# Altium schematic symbol library jlcpcb_2025_04_inductors_extended_0805.schlib: 882 symbols (part 4 of 5) (continued)
## MLF2012E100JT000
designator L?  Inductance: 10uH
Inductor, 10uH, ±5%, 400mΩ, 15mA, SMD 0805; Manufacturer: TDK; Manufacturer Part Number: MLF2012E100JT000; Self-Resonant Frequency: 50MHz; Q Factor: 75@2MHz; Package Size: 0805; JLCPCB Basic Part: No; JLCPCB Part Number: C76742; Supplier 1: LCSC; Category: Inductors; Supplier Part Number 1: C76742; Tolerance: ±5%; Rated Current: 15mA; DC Resistance: 400mΩ; RoHS: Yes; ComponentLink1Description: Datasheet; ComponentLink1URL: https://wmsc.lcsc.com/wmsc/upload/file/pdf/v2/lcsc/2304140030_TDK-MLF2012E100JT000_C76742.pdf; ComponentLink2Description: JLCPCB Part URL; ComponentLink2URL: https://jlcpcb.com/partdetail/C76742; ComponentLink3Description: LCSC Part URL; ComponentLink3URL: https://lcsc.com/product-detail/Inductors-SMD_TDK-TDK-MLF2012E100JT000_C76742.html
footprint IND-0805 (0805 (2012M) Inductor)
pins: 1, 2

## MLF2012E100JTD25
designator L?  Inductance: 10uH
Inductor, 10uH, ±5%, 400mΩ, 15mA, SMD 0805; Manufacturer: TDK; Manufacturer Part Number: MLF2012E100JTD25; Self-Resonant Frequency: 50MHz; Q Factor: 75@2MHz; Package Size: 0805; JLCPCB Basic Part: No; JLCPCB Part Number: C275384; Supplier 1: LCSC; Category: Inductors; Supplier Part Number 1: C275384; Tolerance: ±5%; Rated Current: 15mA; DC Resistance: 400mΩ; RoHS: Yes; ComponentLink1Description: Datasheet; ComponentLink1URL: https://wmsc.lcsc.com/wmsc/upload/file/pdf/v2/lcsc/2304140030_TDK-MLF2012E100JTD25_C275384.pdf; ComponentLink2Description: JLCPCB Part URL; ComponentLink2URL: https://jlcpcb.com/partdetail/C275384; ComponentLink3Description: LCSC Part URL; ComponentLink3URL: https://lcsc.com/product-detail/Inductors-SMD_TDK-TDK-MLF2012E100JTD25_C275384.html
footprint IND-0805 (0805 (2012M) Inductor)
pins: 1, 2

## MLF2012E100KT000
designator L?  Inductance: 10uH
Inductor, 10uH, ±10%, 400mΩ, 15mA, SMD 0805; Manufacturer: TDK; Manufacturer Part Number: MLF2012E100KT000; Self-Resonant Frequency: 30MHz; Q Factor: 75@2MHz; Package Size: 0805; JLCPCB Basic Part: No; JLCPCB Part Number: C76743; Supplier 1: LCSC; Category: Inductors; Supplier Part Number 1: C76743; Tolerance: ±10%; Rated Current: 15mA; DC Resistance: 400mΩ; RoHS: Yes; ComponentLink1Description: Datasheet; ComponentLink1URL: https://wmsc.lcsc.com/wmsc/upload/file/pdf/v2/lcsc/2304140030_TDK-MLF2012E100KT000_C76743.pdf; ComponentLink2Description: JLCPCB Part URL; ComponentLink2URL: https://jlcpcb.com/partdetail/C76743; ComponentLink3Description: LCSC Part URL; ComponentLink3URL: https://lcsc.com/product-detail/Inductors-SMD_TDK-TDK-MLF2012E100KT000_C76743.html
footprint IND-0805 (0805 (2012M) Inductor)
pins: 1, 2

## MLF2012E100KTD25
designator L?  Inductance: 10uH
Inductor, 10uH, ±10%, 400mΩ, 15mA, SMD 0805; Manufacturer: TDK; Manufacturer Part Number: MLF2012E100KTD25; Self-Resonant Frequency: 30MHz; Q Factor: 75@2MHz; Package Size: 0805; JLCPCB Basic Part: No; JLCPCB Part Number: C524464; Supplier 1: LCSC; Category: Inductors; Supplier Part Number 1: C524464; Tolerance: ±10%; Rated Current: 15mA; DC Resistance: 400mΩ; RoHS: Yes; ComponentLink1Description: Datasheet; ComponentLink1URL: https://wmsc.lcsc.com/wmsc/upload/file/pdf/v2/lcsc/2007101533_TDK-MLF2012E100KTD25_C524464.pdf; ComponentLink2Description: JLCPCB Part URL; ComponentLink2URL: https://jlcpcb.com/partdetail/C524464; ComponentLink3Description: LCSC Part URL; ComponentLink3URL: https://lcsc.com/product-detail/Inductors-SMD_TDK-TDK-MLF2012E100KTD25_C524464.html
footprint IND-0805 (0805 (2012M) Inductor)
pins: 1, 2

## MLF2012E120KT000
designator L?  Inductance: 12uH
Inductor, 12uH, ±10%, 500mΩ, 15mA, SMD 0805; Manufacturer: TDK; Manufacturer Part Number: MLF2012E120KT000; Self-Resonant Frequency: 45MHz; Q Factor: 75@2MHz; Package Size: 0805; JLCPCB Basic Part: No; JLCPCB Part Number: C76744; Supplier 1: LCSC; Category: Inductors; Supplier Part Number 1: C76744; Tolerance: ±10%; Rated Current: 15mA; DC Resistance: 500mΩ; RoHS: Yes; ComponentLink1Description: Datasheet; ComponentLink1URL: https://wmsc.lcsc.com/wmsc/upload/file/pdf/v2/lcsc/1810132013_TDK-MLF2012E120KT000_C76744.pdf; ComponentLink2Description: JLCPCB Part URL; ComponentLink2URL: https://jlcpcb.com/partdetail/C76744; ComponentLink3Description: LCSC Part URL; ComponentLink3URL: https://lcsc.com/product-detail/Inductors-SMD_TDK-TDK-MLF2012E120KT000_C76744.html
footprint IND-0805 (0805 (2012M) Inductor)
pins: 1, 2

## MLF2012E120KTD25
designator L?  Inductance: 12uH
Inductor, 12uH, ±10%, 500mΩ, 15mA, SMD 0805; Manufacturer: TDK; Manufacturer Part Number: MLF2012E120KTD25; Self-Resonant Frequency: 45MHz; Q Factor: 75@2MHz; Package Size: 0805; JLCPCB Basic Part: No; JLCPCB Part Number: C307697; Supplier 1: LCSC; Category: Inductors; Supplier Part Number 1: C307697; Tolerance: ±10%; Rated Current: 15mA; DC Resistance: 500mΩ; RoHS: Yes; ComponentLink1Description: Datasheet; ComponentLink1URL: https://wmsc.lcsc.com/wmsc/upload/file/pdf/v2/lcsc/2304140030_TDK-MLF2012E120KTD25_C307697.pdf; ComponentLink2Description: JLCPCB Part URL; ComponentLink2URL: https://jlcpcb.com/partdetail/C307697; ComponentLink3Description: LCSC Part URL; ComponentLink3URL: https://lcsc.com/product-detail/Inductors-SMD_TDK-TDK-MLF2012E120KTD25_C307697.html
footprint IND-0805 (0805 (2012M) Inductor)
pins: 1, 2

## MLF2012K470KT000
designator L?  Inductance: 47uH
Inductor, 47uH, ±10%, 1.6Ω, 4mA, SMD 0805; Manufacturer: TDK; Manufacturer Part Number: MLF2012K470KT000; Self-Resonant Frequency: 11MHz; Q Factor: 55@2MHz; Package Size: 0805; JLCPCB Basic Part: No; JLCPCB Part Number: C275387; Supplier 1: LCSC; Category: Inductors; Supplier Part Number 1: C275387; Tolerance: ±10%; Rated Current: 4mA; DC Resistance: 1.6Ω; RoHS: Yes; ComponentLink1Description: Datasheet; ComponentLink1URL: https://wmsc.lcsc.com/wmsc/upload/file/pdf/v2/lcsc/2304140030_TDK-MLF2012K470KT000_C275387.pdf; ComponentLink2Description: JLCPCB Part URL; ComponentLink2URL: https://jlcpcb.com/partdetail/C275387; ComponentLink3Description: LCSC Part URL; ComponentLink3URL: https://lcsc.com/product-detail/Inductors-SMD_TDK-TDK-MLF2012K470KT000_C275387.html
footprint IND-0805 (0805 (2012M) Inductor)
pins: 1, 2

## MLF2012K470KTD25
designator L?  Inductance: 47uH
Inductor, 47uH, ±10%, 1.6Ω, 4mA, SMD 0805; Manufacturer: TDK; Manufacturer Part Number: MLF2012K470KTD25; Self-Resonant Frequency: 20MHz; Q Factor: 55@2MHz; Package Size: 0805; JLCPCB Basic Part: No; JLCPCB Part Number: C404479; Supplier 1: LCSC; Category: Inductors; Supplier Part Number 1: C404479; Tolerance: ±10%; Rated Current: 4mA; DC Resistance: 1.6Ω; RoHS: Yes; ComponentLink1Description: Datasheet; ComponentLink1URL: https://wmsc.lcsc.com/wmsc/upload/file/pdf/v2/lcsc/2304140030_TDK-MLF2012K470KTD25_C404479.pdf; ComponentLink2Description: JLCPCB Part URL; ComponentLink2URL: https://jlcpcb.com/partdetail/C404479; ComponentLink3Description: LCSC Part URL; ComponentLink3URL: https://lcsc.com/product-detail/Inductors-SMD_TDK-TDK-MLF2012K470KTD25_C404479.html
footprint IND-0805 (0805 (2012M) Inductor)
pins: 1, 2

## MLF2012K560KT000
designator L?  Inductance: 56uH
Inductor, 56uH, ±10%, 1.8Ω, 4mA, SMD 0805; Manufacturer: TDK; Manufacturer Part Number: MLF2012K560KT000; Self-Resonant Frequency: 10MHz; Q Factor: 55@2MHz; Package Size: 0805; JLCPCB Basic Part: No; JLCPCB Part Number: C524459; Supplier 1: LCSC; Category: Inductors; Supplier Part Number 1: C524459; Tolerance: ±10%; Rated Current: 4mA; DC Resistance: 1.8Ω; RoHS: Yes; ComponentLink1Description: Datasheet; ComponentLink1URL: https://wmsc.lcsc.com/wmsc/upload/file/pdf/v2/lcsc/2007171235_TDK-MLF2012K560KT000_C524459.pdf; ComponentLink2Description: JLCPCB Part URL; ComponentLink2URL: https://jlcpcb.com/partdetail/C524459; ComponentLink3Description: LCSC Part URL; ComponentLink3URL: https://lcsc.com/product-detail/Inductors-SMD_TDK-TDK-MLF2012K560KT000_C524459.html
footprint IND-0805 (0805 (2012M) Inductor)
pins: 1, 2

## MLI2012-2R7_F_
designator L?  Inductance: 2.7uH
Inductor, 2.7uH, ±10%, 750mΩ, 30mA, SMD 0805; Manufacturer: Meled; Manufacturer Part Number: MLI2012-2R7(F); Package Size: 0805; JLCPCB Basic Part: No; JLCPCB Part Number: C24183; Supplier 1: LCSC; Category: Inductors; Supplier Part Number 1: C24183; Tolerance: ±10%; Rated Current: 30mA; DC Resistance: 750mΩ; RoHS: Yes; ComponentLink1Description: Datasheet; ComponentLink1URL: https://wmsc.lcsc.com/wmsc/upload/file/pdf/v2/lcsc/1809140120_MetalLions-MLI2012-2R7-F_C24183.pdf; ComponentLink2Description: JLCPCB Part URL; ComponentLink2URL: https://jlcpcb.com/partdetail/C24183; ComponentLink3Description: LCSC Part URL; ComponentLink3URL: https://lcsc.com/product-detail/Inductors-SMD_Meled-Meled-MLI2012-2R7F_C24183.html
footprint IND-0805 (0805 (2012M) Inductor)
pins: 1, 2

## MLI2012-4R7_f _
designator L?  Inductance: 4.7uH
Inductor, 4.7uH, ±10%, 1Ω, 30mA, SMD 0805; Manufacturer: Meled; Manufacturer Part Number: MLI2012-4R7(f ); Package Size: 0805; JLCPCB Basic Part: No; JLCPCB Part Number: C1044; Supplier 1: LCSC; Category: Inductors; Supplier Part Number 1: C1044; Tolerance: ±10%; Rated Current: 30mA; DC Resistance: 1Ω; RoHS: Yes; ComponentLink1Description: Datasheet; ComponentLink1URL: https://wmsc.lcsc.com/wmsc/upload/file/pdf/v2/lcsc/1809192213_MetalLions-MLI2012-4R7-f-_C1044.pdf; ComponentLink2Description: JLCPCB Part URL; ComponentLink2URL: https://jlcpcb.com/partdetail/C1044; ComponentLink3Description: LCSC Part URL; ComponentLink3URL: https://lcsc.com/product-detail/Inductors-SMD_Meled-Meled-MLI2012-4R7f-_C1044.html
footprint IND-0805 (0805 (2012M) Inductor)
pins: 1, 2

## MLI2012-10N
designator L?  Inductance: 10nH
Inductor, 10nH, ±5%, 300mΩ, 300mA, SMD 0805; Manufacturer: Meled; Manufacturer Part Number: MLI2012-10N; Package Size: 0805; JLCPCB Basic Part: No; JLCPCB Part Number: C14457; Supplier 1: LCSC; Category: Inductors; Supplier Part Number 1: C14457; Tolerance: ±5%; Rated Current: 300mA; DC Resistance: 300mΩ; RoHS: Yes; ComponentLink1Description: Datasheet; ComponentLink1URL: https://wmsc.lcsc.com/wmsc/upload/file/pdf/v2/lcsc/1809212010_MetalLions-MLI2012-10N_C14457.pdf; ComponentLink2Description: JLCPCB Part URL; ComponentLink2URL: https://jlcpcb.com/partdetail/C14457; ComponentLink3Description: LCSC Part URL; ComponentLink3URL: https://lcsc.com/product-detail/Inductors-SMD_Meled-Meled-MLI2012-10N_C14457.html
footprint IND-0805 (0805 (2012M) Inductor)
pins: 1, 2

## MLI2012-18N
designator L?  Inductance: 18nH
Inductor, 18nH, ±5%, 450mΩ, 300mA, SMD 0805; Manufacturer: Meled; Manufacturer Part Number: MLI2012-18N; Package Size: 0805; JLCPCB Basic Part: No; JLCPCB Part Number: C14460; Supplier 1: LCSC; Category: Inductors; Supplier Part Number 1: C14460; Tolerance: ±5%; Rated Current: 300mA; DC Resistance: 450mΩ; RoHS: Yes; ComponentLink1Description: Datasheet; ComponentLink1URL: https://wmsc.lcsc.com/wmsc/upload/file/pdf/v2/lcsc/1809212053_MetalLions-MLI2012-18N_C14460.pdf; ComponentLink2Description: JLCPCB Part URL; ComponentLink2URL: https://jlcpcb.com/partdetail/C14460; ComponentLink3Description: LCSC Part URL; ComponentLink3URL: https://lcsc.com/product-detail/Inductors-SMD_Meled-Meled-MLI2012-18N_C14460.html
footprint IND-0805 (0805 (2012M) Inductor)
pins: 1, 2

## MLI2012-22N
designator L?  Inductance: 22nH
Inductor, 22nH, ±5%, 500mΩ, 300mA, SMD 0805; Manufacturer: Meled; Manufacturer Part Number: MLI2012-22N; Package Size: 0805; JLCPCB Basic Part: No; JLCPCB Part Number: C14459; Supplier 1: LCSC; Category: Inductors; Supplier Part Number 1: C14459; Tolerance: ±5%; Rated Current: 300mA; DC Resistance: 500mΩ; RoHS: Yes; ComponentLink1Description: Datasheet; ComponentLink1URL: https://wmsc.lcsc.com/wmsc/upload/file/pdf/v2/lcsc/1809191812_MetalLions-MLI2012-22N_C14459.pdf; ComponentLink2Description: JLCPCB Part URL; ComponentLink2URL: https://jlcpcb.com/partdetail/C14459; ComponentLink3Description: LCSC Part URL; ComponentLink3URL: https://lcsc.com/product-detail/Inductors-SMD_Meled-Meled-MLI2012-22N_C14459.html
footprint IND-0805 (0805 (2012M) Inductor)
pins: 1, 2

## MLI2012-27N_f_
designator L?  Inductance: 27nH
Inductor, 27nH, ±5%, 550mΩ, 300mA, SMD 0805; Manufacturer: Meled; Manufacturer Part Number: MLI2012-27N(f); Package Size: 0805; JLCPCB Basic Part: No; JLCPCB Part Number: C56586; Supplier 1: LCSC; Category: Inductors; Supplier Part Number 1: C56586; Tolerance: ±5%; Rated Current: 300mA; DC Resistance: 550mΩ; RoHS: Yes; ComponentLink1Description: Datasheet; ComponentLink1URL: https://wmsc.lcsc.com/wmsc/upload/file/pdf/v2/lcsc/1809132312_MetalLions-MLI2012-27N-f_C56586.pdf; ComponentLink2Description: JLCPCB Part URL; ComponentLink2URL: https://jlcpcb.com/partdetail/C56586; ComponentLink3Description: LCSC Part URL; ComponentLink3URL: https://lcsc.com/product-detail/Inductors-SMD_Meled-Meled-MLI2012-27Nf_C56586.html
footprint IND-0805 (0805 (2012M) Inductor)
pins: 1, 2

## MLI2012-36N_f_
designator L?  Inductance: 36nH
Inductor, 36nH, ±5%, 600mΩ, 300mA, SMD 0805; Manufacturer: Meled; Manufacturer Part Number: MLI2012-36N(f); Package Size: 0805; JLCPCB Basic Part: No; JLCPCB Part Number: C21941; Supplier 1: LCSC; Category: Inductors; Supplier Part Number 1: C21941; Tolerance: ±5%; Rated Current: 300mA; DC Resistance: 600mΩ; RoHS: Yes; ComponentLink1Description: Datasheet; ComponentLink1URL: https://wmsc.lcsc.com/wmsc/upload/file/pdf/v2/lcsc/1809140120_MetalLions-MLI2012-36N-f_C21941.pdf; ComponentLink2Description: JLCPCB Part URL; ComponentLink2URL: https://jlcpcb.com/partdetail/C21941; ComponentLink3Description: LCSC Part URL; ComponentLink3URL: https://lcsc.com/product-detail/Inductors-SMD_Meled-Meled-MLI2012-36Nf_C21941.html
footprint IND-0805 (0805 (2012M) Inductor)
pins: 1, 2

## MLI2012-39N_F_
designator L?  Inductance: 39nH
Inductor, 39nH, ±5%, 650mΩ, 300mA, SMD 0805; Manufacturer: Meled; Manufacturer Part Number: MLI2012-39N（F）; Package Size: 0805; JLCPCB Basic Part: No; JLCPCB Part Number: C12328; Supplier 1: LCSC; Category: Inductors; Supplier Part Number 1: C12328; Tolerance: ±5%; Rated Current: 300mA; DC Resistance: 650mΩ; RoHS: Yes; ComponentLink1Description: Datasheet; ComponentLink1URL: https://wmsc.lcsc.com/wmsc/upload/file/pdf/v2/lcsc/1809212031_MetalLions-MLI2012-39N-F-_C12328.pdf; ComponentLink2Description: JLCPCB Part URL; ComponentLink2URL: https://jlcpcb.com/partdetail/C12328; ComponentLink3Description: LCSC Part URL; ComponentLink3URL: https://lcsc.com/product-detail/Inductors-SMD_Meled-Meled-MLI2012-39N%EF%BC%88F%EF%BC%89_C12328.html
footprint IND-0805 (0805 (2012M) Inductor)
pins: 1, 2

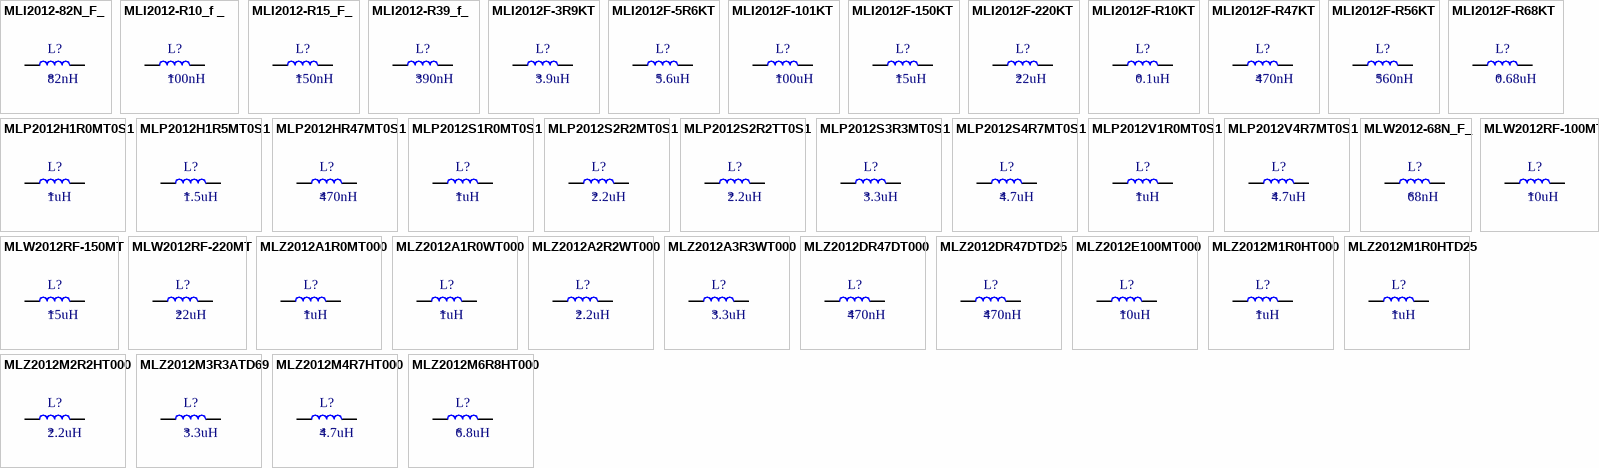
[diagram p16: symbols MLI2012-82N_F_ to MLZ2012M6R8HT000]

## MLI2012-82N_F_
designator L?  Inductance: 82nH
Inductor, 82nH, ±5%, 900mΩ, 300mA, SMD 0805; Manufacturer: Meled; Manufacturer Part Number: MLI2012-82N(F); Package Size: 0805; JLCPCB Basic Part: No; JLCPCB Part Number: C54866; Supplier 1: LCSC; Category: Inductors; Supplier Part Number 1: C54866; Tolerance: ±5%; Rated Current: 300mA; DC Resistance: 900mΩ; RoHS: Yes; ComponentLink1Description: Datasheet; ComponentLink1URL: https://wmsc.lcsc.com/wmsc/upload/file/pdf/v2/lcsc/1809140026_MetalLions-MLI2012-82N-F_C54866.pdf; ComponentLink2Description: JLCPCB Part URL; ComponentLink2URL: https://jlcpcb.com/partdetail/C54866; ComponentLink3Description: LCSC Part URL; ComponentLink3URL: https://lcsc.com/product-detail/Inductors-SMD_Meled-Meled-MLI2012-82NF_C54866.html
footprint IND-0805 (0805 (2012M) Inductor)
pins: 1, 2

## MLI2012-R10_f _
designator L?  Inductance: 100nH
Inductor, 100nH, ±5%, 1Ω, 300mA, SMD 0805; Manufacturer: Meled; Manufacturer Part Number: MLI2012-R10(f ); Package Size: 0805; JLCPCB Basic Part: No; JLCPCB Part Number: C32878; Supplier 1: LCSC; Category: Inductors; Supplier Part Number 1: C32878; Tolerance: ±5%; Rated Current: 300mA; DC Resistance: 1Ω; RoHS: Yes; ComponentLink1Description: Datasheet; ComponentLink1URL: https://wmsc.lcsc.com/wmsc/upload/file/pdf/v2/lcsc/1809212031_MetalLions-MLI2012-R10-f-_C32878.pdf; ComponentLink2Description: JLCPCB Part URL; ComponentLink2URL: https://jlcpcb.com/partdetail/C32878; ComponentLink3Description: LCSC Part URL; ComponentLink3URL: https://lcsc.com/product-detail/Inductors-SMD_Meled-Meled-MLI2012-R10f-_C32878.html
footprint IND-0805 (0805 (2012M) Inductor)
pins: 1, 2

## MLI2012-R15_F_
designator L?  Inductance: 150nH
Inductor, 150nH, ±10%, 400mΩ, 250mA, SMD 0805; Manufacturer: Meled; Manufacturer Part Number: MLI2012-R15(F); Package Size: 0805; JLCPCB Basic Part: No; JLCPCB Part Number: C30618; Supplier 1: LCSC; Category: Inductors; Supplier Part Number 1: C30618; Tolerance: ±10%; Rated Current: 250mA; DC Resistance: 400mΩ; RoHS: Yes; ComponentLink1Description: Datasheet; ComponentLink1URL: https://wmsc.lcsc.com/wmsc/upload/file/pdf/v2/lcsc/1809212031_MetalLions-MLI2012-R15-F_C30618.pdf; ComponentLink2Description: JLCPCB Part URL; ComponentLink2URL: https://jlcpcb.com/partdetail/C30618; ComponentLink3Description: LCSC Part URL; ComponentLink3URL: https://lcsc.com/product-detail/Inductors-SMD_Meled-Meled-MLI2012-R15F_C30618.html
footprint IND-0805 (0805 (2012M) Inductor)
pins: 1, 2

## MLI2012-R39_f_
designator L?  Inductance: 390nH
Inductor, 390nH, ±10%, 650mΩ, 200mA, SMD 0805; Manufacturer: Meled; Manufacturer Part Number: MLI2012-R39(f); Package Size: 0805; JLCPCB Basic Part: No; JLCPCB Part Number: C29972; Supplier 1: LCSC; Category: Inductors; Supplier Part Number 1: C29972; Tolerance: ±10%; Rated Current: 200mA; DC Resistance: 650mΩ; RoHS: Yes; ComponentLink1Description: Datasheet; ComponentLink1URL: https://wmsc.lcsc.com/wmsc/upload/file/pdf/v2/lcsc/1809280910_MetalLions-MLI2012-R39-f_C29972.pdf; ComponentLink2Description: JLCPCB Part URL; ComponentLink2URL: https://jlcpcb.com/partdetail/C29972; ComponentLink3Description: LCSC Part URL; ComponentLink3URL: https://lcsc.com/product-detail/Inductors-SMD_Meled-Meled-MLI2012-R39f_C29972.html
footprint IND-0805 (0805 (2012M) Inductor)
pins: 1, 2

## MLI2012F-3R9KT
designator L?  Inductance: 3.9uH
Inductor, 3.9uH, ±10%, 0.8Ω, 30mA, SMD 0805; Manufacturer: Meled; Manufacturer Part Number: MLI2012F-3R9KT; Self-Resonant Frequency: 38MHz; Q Factor: 45@10MHz; Package Size: 0805; JLCPCB Basic Part: No; JLCPCB Part Number: C2885893; Supplier 1: LCSC; Category: Inductors; Supplier Part Number 1: C2885893; Tolerance: ±10%; Rated Current: 30mA; DC Resistance: 0.8Ω; RoHS: Yes; ComponentLink1Description: Datasheet; ComponentLink1URL: https://wmsc.lcsc.com/wmsc/upload/file/pdf/v2/lcsc/2306021138_MetalLions-MLI2012F-3R9KT_C2885893.pdf; ComponentLink2Description: JLCPCB Part URL; ComponentLink2URL: https://jlcpcb.com/partdetail/C2885893; ComponentLink3Description: LCSC Part URL; ComponentLink3URL: https://lcsc.com/product-detail/Inductors-SMD_MetalLions-MetalLions-MLI2012F-3R9KT_C2885893.html
footprint IND-0805 (0805 (2012M) Inductor)
pins: 1, 2

## MLI2012F-5R6KT
designator L?  Inductance: 5.6uH
Inductor, 5.6uH, ±10%, 0.9Ω, 15mA, SMD 0805; Manufacturer: Meled; Manufacturer Part Number: MLI2012F-5R6KT; Self-Resonant Frequency: 32MHz; Q Factor: 50@4MHz; Package Size: 0805; JLCPCB Basic Part: No; JLCPCB Part Number: C2885895; Supplier 1: LCSC; Category: Inductors; Supplier Part Number 1: C2885895; Tolerance: ±10%; Rated Current: 15mA; DC Resistance: 0.9Ω; RoHS: Yes; ComponentLink1Description: Datasheet; ComponentLink1URL: https://wmsc.lcsc.com/wmsc/upload/file/pdf/v2/lcsc/2306021138_MetalLions-MLI2012F-5R6KT_C2885895.pdf; ComponentLink2Description: JLCPCB Part URL; ComponentLink2URL: https://jlcpcb.com/partdetail/C2885895; ComponentLink3Description: LCSC Part URL; ComponentLink3URL: https://lcsc.com/product-detail/Inductors-SMD_MetalLions-MetalLions-MLI2012F-5R6KT_C2885895.html
footprint IND-0805 (0805 (2012M) Inductor)
pins: 1, 2

## MLI2012F-101KT
designator L?  Inductance: 100uH
Inductor, 100uH, ±10%, 3.1Ω, 2mA, SMD 0805; Manufacturer: Meled; Manufacturer Part Number: MLI2012F-101KT; Self-Resonant Frequency: 5.5MHz; Q Factor: 25@1MHz; Package Size: 0805; JLCPCB Basic Part: No; JLCPCB Part Number: C2885906; Supplier 1: LCSC; Category: Inductors; Supplier Part Number 1: C2885906; Tolerance: ±10%; Rated Current: 2mA; DC Resistance: 3.1Ω; RoHS: Yes; ComponentLink1Description: Datasheet; ComponentLink1URL: https://wmsc.lcsc.com/wmsc/upload/file/pdf/v2/lcsc/2306021138_MetalLions-MLI2012F-101KT_C2885906.pdf; ComponentLink2Description: JLCPCB Part URL; ComponentLink2URL: https://jlcpcb.com/partdetail/C2885906; ComponentLink3Description: LCSC Part URL; ComponentLink3URL: https://lcsc.com/product-detail/Inductors-SMD_MetalLions-MetalLions-MLI2012F-101KT_C2885906.html
footprint IND-0805 (0805 (2012M) Inductor)
pins: 1, 2

## MLI2012F-150KT
designator L?  Inductance: 15uH
Inductor, 15uH, ±10%, 0.8Ω, 5mA, SMD 0805; Manufacturer: Meled; Manufacturer Part Number: MLI2012F-150KT; Self-Resonant Frequency: 19MHz; Q Factor: 30@1MHz; Package Size: 0805; JLCPCB Basic Part: No; JLCPCB Part Number: C2885900; Supplier 1: LCSC; Category: Inductors; Supplier Part Number 1: C2885900; Tolerance: ±10%; Rated Current: 5mA; DC Resistance: 0.8Ω; RoHS: Yes; ComponentLink1Description: Datasheet; ComponentLink1URL: https://wmsc.lcsc.com/wmsc/upload/file/pdf/v2/lcsc/2306021138_MetalLions-MLI2012F-150KT_C2885900.pdf; ComponentLink2Description: JLCPCB Part URL; ComponentLink2URL: https://jlcpcb.com/partdetail/C2885900; ComponentLink3Description: LCSC Part URL; ComponentLink3URL: https://lcsc.com/product-detail/Inductors-SMD_MetalLions-MetalLions-MLI2012F-150KT_C2885900.html
footprint IND-0805 (0805 (2012M) Inductor)
pins: 1, 2

## MLI2012F-220KT
designator L?  Inductance: 22uH
Inductor, 22uH, ±10%, 1.1Ω, 5mA, SMD 0805; Manufacturer: Meled; Manufacturer Part Number: MLI2012F-220KT; Self-Resonant Frequency: 16MHz; Q Factor: 30@1MHz; Package Size: 0805; JLCPCB Basic Part: No; JLCPCB Part Number: C2885902; Supplier 1: LCSC; Category: Inductors; Supplier Part Number 1: C2885902; Tolerance: ±10%; Rated Current: 5mA; DC Resistance: 1.1Ω; RoHS: Yes; ComponentLink1Description: Datasheet; ComponentLink1URL: https://wmsc.lcsc.com/wmsc/upload/file/pdf/v2/lcsc/2306021138_MetalLions-MLI2012F-220KT_C2885902.pdf; ComponentLink2Description: JLCPCB Part URL; ComponentLink2URL: https://jlcpcb.com/partdetail/C2885902; ComponentLink3Description: LCSC Part URL; ComponentLink3URL: https://lcsc.com/product-detail/Inductors-SMD_MetalLions-MetalLions-MLI2012F-220KT_C2885902.html
footprint IND-0805 (0805 (2012M) Inductor)
pins: 1, 2

## MLI2012F-R10KT
designator L?  Inductance: 0.1uH
Inductor, 0.1uH, ±10%, 0.3Ω, 250mA, SMD 0805; Manufacturer: Meled; Manufacturer Part Number: MLI2012F-R10KT; Self-Resonant Frequency: 235MHz; Q Factor: 20@25MHz; Package Size: 0805; JLCPCB Basic Part: No; JLCPCB Part Number: C2885875; Supplier 1: LCSC; Category: Inductors; Supplier Part Number 1: C2885875; Tolerance: ±10%; Rated Current: 250mA; DC Resistance: 0.3Ω; RoHS: Yes; ComponentLink1Description: Datasheet; ComponentLink1URL: https://wmsc.lcsc.com/wmsc/upload/file/pdf/v2/lcsc/2306021138_MetalLions-MLI2012F-R10KT_C2885875.pdf; ComponentLink2Description: JLCPCB Part URL; ComponentLink2URL: https://jlcpcb.com/partdetail/C2885875; ComponentLink3Description: LCSC Part URL; ComponentLink3URL: https://lcsc.com/product-detail/Inductors-SMD_MetalLions-MetalLions-MLI2012F-R10KT_C2885875.html
footprint IND-0805 (0805 (2012M) Inductor)
pins: 1, 2

## MLI2012F-R47KT
designator L?  Inductance: 470nH
Inductor, 470nH, ±10%, 0.65Ω, 200mA, SMD 0805; Manufacturer: Meled; Manufacturer Part Number: MLI2012F-R47KT; Self-Resonant Frequency: 125MHz; Q Factor: 25@25MHz; Package Size: 0805; JLCPCB Basic Part: No; JLCPCB Part Number: C2885882; Supplier 1: LCSC; Category: Inductors; Supplier Part Number 1: C2885882; Tolerance: ±10%; Rated Current: 200mA; DC Resistance: 0.65Ω; RoHS: Yes; ComponentLink1Description: Datasheet; ComponentLink1URL: https://wmsc.lcsc.com/wmsc/upload/file/pdf/v2/lcsc/2306021138_MetalLions-MLI2012F-R47KT_C2885882.pdf; ComponentLink2Description: JLCPCB Part URL; ComponentLink2URL: https://jlcpcb.com/partdetail/C2885882; ComponentLink3Description: LCSC Part URL; ComponentLink3URL: https://lcsc.com/product-detail/Inductors-SMD_MetalLions-MetalLions-MLI2012F-R47KT_C2885882.html
footprint IND-0805 (0805 (2012M) Inductor)
pins: 1, 2

## MLI2012F-R56KT
designator L?  Inductance: 560nH
Inductor, 560nH, ±10%, 750mΩ, 150mA, SMD 0805; Manufacturer: Meled; Manufacturer Part Number: MLI2012F-R56KT; Self-Resonant Frequency: 115MHz; Q Factor: 25@25MHz; Package Size: 0805; JLCPCB Basic Part: No; JLCPCB Part Number: C2885883; Supplier 1: LCSC; Category: Inductors; Supplier Part Number 1: C2885883; Tolerance: ±10%; Rated Current: 150mA; DC Resistance: 750mΩ; RoHS: Yes; ComponentLink1Description: Datasheet; ComponentLink1URL: https://wmsc.lcsc.com/wmsc/upload/file/pdf/v2/lcsc/2306021138_MetalLions-MLI2012F-R56KT_C2885883.pdf; ComponentLink2Description: JLCPCB Part URL; ComponentLink2URL: https://jlcpcb.com/partdetail/C2885883; ComponentLink3Description: LCSC Part URL; ComponentLink3URL: https://lcsc.com/product-detail/Inductors-SMD_MetalLions-MetalLions-MLI2012F-R56KT_C2885883.html
footprint IND-0805 (0805 (2012M) Inductor)
pins: 1, 2

## MLI2012F-R68KT
designator L?  Inductance: 0.68uH
Inductor, 0.68uH, ±10%, 0.8Ω, 150mA, SMD 0805; Manufacturer: Meled; Manufacturer Part Number: MLI2012F-R68KT; Self-Resonant Frequency: 105MHz; Q Factor: 25@25MHz; Package Size: 0805; JLCPCB Basic Part: No; JLCPCB Part Number: C2885884; Supplier 1: LCSC; Category: Inductors; Supplier Part Number 1: C2885884; Tolerance: ±10%; Rated Current: 150mA; DC Resistance: 0.8Ω; RoHS: Yes; ComponentLink1Description: Datasheet; ComponentLink1URL: https://wmsc.lcsc.com/wmsc/upload/file/pdf/v2/lcsc/2306021138_MetalLions-MLI2012F-R68KT_C2885884.pdf; ComponentLink2Description: JLCPCB Part URL; ComponentLink2URL: https://jlcpcb.com/partdetail/C2885884; ComponentLink3Description: LCSC Part URL; ComponentLink3URL: https://lcsc.com/product-detail/Inductors-SMD_MetalLions-MetalLions-MLI2012F-R68KT_C2885884.html
footprint IND-0805 (0805 (2012M) Inductor)
pins: 1, 2

## MLP2012H1R0MT0S1
designator L?  Inductance: 1uH
Inductor, 1uH, ±20%, 120mΩ, 1.1A, SMD 0805; Manufacturer: TDK; Manufacturer Part Number: MLP2012H1R0MT0S1; Package Size: 0805; JLCPCB Basic Part: No; JLCPCB Part Number: C307742; Supplier 1: LCSC; Category: Inductors; Supplier Part Number 1: C307742; Tolerance: ±20%; Rated Current: 1.1A; DC Resistance: 120mΩ; RoHS: Yes; ComponentLink1Description: Datasheet; ComponentLink1URL: https://wmsc.lcsc.com/wmsc/upload/file/pdf/v2/lcsc/2304140030_TDK-MLP2012H1R0MT0S1_C307742.pdf; ComponentLink2Description: JLCPCB Part URL; ComponentLink2URL: https://jlcpcb.com/partdetail/C307742; ComponentLink3Description: LCSC Part URL; ComponentLink3URL: https://lcsc.com/product-detail/Inductors-SMD_TDK-TDK-MLP2012H1R0MT0S1_C307742.html
footprint IND-0805 (0805 (2012M) Inductor)
pins: 1, 2

## MLP2012H1R5MT0S1
designator L?  Inductance: 1.5uH
Inductor, 1.5uH, ±20%, 120mΩ, 1.1A, SMD 0805; Manufacturer: TDK; Manufacturer Part Number: MLP2012H1R5MT0S1; Package Size: 0805; JLCPCB Basic Part: No; JLCPCB Part Number: C2042639; Supplier 1: LCSC; Category: Inductors; Supplier Part Number 1: C2042639; Tolerance: ±20%; Rated Current: 1.1A; DC Resistance: 120mΩ; RoHS: Yes; ComponentLink1Description: Datasheet; ComponentLink1URL: https://wmsc.lcsc.com/wmsc/upload/file/pdf/v2/lcsc/2304140030_TDK-MLP2012H1R5MT0S1_C2042639.pdf; ComponentLink2Description: JLCPCB Part URL; ComponentLink2URL: https://jlcpcb.com/partdetail/C2042639; ComponentLink3Description: LCSC Part URL; ComponentLink3URL: https://lcsc.com/product-detail/Inductors-SMD_TDK-TDK-MLP2012H1R5MT0S1_C2042639.html
footprint IND-0805 (0805 (2012M) Inductor)
pins: 1, 2

## MLP2012HR47MT0S1
designator L?  Inductance: 470nH
Inductor, 470nH, ±20%, 70mΩ, 1.3A, SMD 0805; Manufacturer: TDK; Manufacturer Part Number: MLP2012HR47MT0S1; Package Size: 0805; JLCPCB Basic Part: No; JLCPCB Part Number: C307743; Supplier 1: LCSC; Category: Inductors; Supplier Part Number 1: C307743; Tolerance: ±20%; Rated Current: 1.3A; DC Resistance: 70mΩ; RoHS: Yes; ComponentLink1Description: Datasheet; ComponentLink1URL: https://wmsc.lcsc.com/wmsc/upload/file/pdf/v2/lcsc/2304140030_TDK-MLP2012HR47MT0S1_C307743.pdf; ComponentLink2Description: JLCPCB Part URL; ComponentLink2URL: https://jlcpcb.com/partdetail/C307743; ComponentLink3Description: LCSC Part URL; ComponentLink3URL: https://lcsc.com/product-detail/Inductors-SMD_TDK-TDK-MLP2012HR47MT0S1_C307743.html
footprint IND-0805 (0805 (2012M) Inductor)
pins: 1, 2

## MLP2012S1R0MT0S1
designator L?  Inductance: 1uH
Inductor, 1uH, ±20%, 160mΩ, 1A, SMD 0805; Manufacturer: TDK; Manufacturer Part Number: MLP2012S1R0MT0S1; Package Size: 0805; JLCPCB Basic Part: No; JLCPCB Part Number: C383371; Supplier 1: LCSC; Category: Inductors; Supplier Part Number 1: C383371; Tolerance: ±20%; Rated Current: 1A; DC Resistance: 160mΩ; RoHS: Yes; ComponentLink1Description: Datasheet; ComponentLink1URL: https://wmsc.lcsc.com/wmsc/upload/file/pdf/v2/lcsc/2304140030_TDK-MLP2012S1R0MT0S1_C383371.pdf; ComponentLink2Description: JLCPCB Part URL; ComponentLink2URL: https://jlcpcb.com/partdetail/C383371; ComponentLink3Description: LCSC Part URL; ComponentLink3URL: https://lcsc.com/product-detail/Inductors-SMD_TDK-TDK-MLP2012S1R0MT0S1_C383371.html
footprint IND-0805 (0805 (2012M) Inductor)
pins: 1, 2

## MLP2012S2R2MT0S1
designator L?  Inductance: 2.2uH
Inductor, 2.2uH, ±20%, 230mΩ, 800mA, SMD 0805; Manufacturer: TDK; Manufacturer Part Number: MLP2012S2R2MT0S1; Package Size: 0805; JLCPCB Basic Part: No; JLCPCB Part Number: C107322; Supplier 1: LCSC; Category: Inductors; Supplier Part Number 1: C107322; Tolerance: ±20%; Rated Current: 800mA; DC Resistance: 230mΩ; RoHS: Yes; ComponentLink1Description: Datasheet; ComponentLink1URL: https://wmsc.lcsc.com/wmsc/upload/file/pdf/v2/lcsc/1810132030_TDK-MLP2012S2R2MT0S1_C107322.pdf; ComponentLink2Description: JLCPCB Part URL; ComponentLink2URL: https://jlcpcb.com/partdetail/C107322; ComponentLink3Description: LCSC Part URL; ComponentLink3URL: https://lcsc.com/product-detail/Inductors-SMD_TDK-TDK-MLP2012S2R2MT0S1_C107322.html
footprint IND-0805 (0805 (2012M) Inductor)
pins: 1, 2

## MLP2012S2R2TT0S1
designator L?  Inductance: 2.2uH
Inductor, 2.2uH, ±20%, 330mΩ, 600mA, SMD 0805; Manufacturer: TDK; Manufacturer Part Number: MLP2012S2R2TT0S1; Package Size: 0805; JLCPCB Basic Part: No; JLCPCB Part Number: C383373; Supplier 1: LCSC; Category: Inductors; Supplier Part Number 1: C383373; Tolerance: ±20%; Rated Current: 600mA; DC Resistance: 330mΩ; RoHS: Yes; ComponentLink1Description: Datasheet; ComponentLink1URL: https://wmsc.lcsc.com/wmsc/upload/file/pdf/v2/lcsc/2304140030_TDK-MLP2012S2R2TT0S1_C383373.pdf; ComponentLink2Description: JLCPCB Part URL; ComponentLink2URL: https://jlcpcb.com/partdetail/C383373; ComponentLink3Description: LCSC Part URL; ComponentLink3URL: https://lcsc.com/product-detail/Inductors-SMD_TDK-TDK-MLP2012S2R2TT0S1_C383373.html
footprint IND-0805 (0805 (2012M) Inductor)
pins: 1, 2

## MLP2012S3R3MT0S1
designator L?  Inductance: 3.3uH
Inductor, 3.3uH, ±20%, 190mΩ, 900mA, SMD 0805; Manufacturer: TDK; Manufacturer Part Number: MLP2012S3R3MT0S1; Package Size: 0805; JLCPCB Basic Part: No; JLCPCB Part Number: C307744; Supplier 1: LCSC; Category: Inductors; Supplier Part Number 1: C307744; Tolerance: ±20%; Rated Current: 900mA; DC Resistance: 190mΩ; RoHS: Yes; ComponentLink1Description: Datasheet; ComponentLink1URL: https://wmsc.lcsc.com/wmsc/upload/file/pdf/v2/lcsc/2304140030_TDK-MLP2012S3R3MT0S1_C307744.pdf; ComponentLink2Description: JLCPCB Part URL; ComponentLink2URL: https://jlcpcb.com/partdetail/C307744; ComponentLink3Description: LCSC Part URL; ComponentLink3URL: https://lcsc.com/product-detail/Inductors-SMD_TDK-TDK-MLP2012S3R3MT0S1_C307744.html
footprint IND-0805 (0805 (2012M) Inductor)
pins: 1, 2

## MLP2012S4R7MT0S1
designator L?  Inductance: 4.7uH
Inductor, 4.7uH, ±20%, 260mΩ, 700mA, SMD 0805; Manufacturer: TDK; Manufacturer Part Number: MLP2012S4R7MT0S1; Package Size: 0805; JLCPCB Basic Part: No; JLCPCB Part Number: C87543; Supplier 1: LCSC; Category: Inductors; Supplier Part Number 1: C87543; Tolerance: ±20%; Rated Current: 700mA; DC Resistance: 260mΩ; RoHS: Yes; ComponentLink1Description: Datasheet; ComponentLink1URL: https://wmsc.lcsc.com/wmsc/upload/file/pdf/v2/lcsc/1810132012_TDK-MLP2012S4R7MT0S1_C87543.pdf; ComponentLink2Description: JLCPCB Part URL; ComponentLink2URL: https://jlcpcb.com/partdetail/C87543; ComponentLink3Description: LCSC Part URL; ComponentLink3URL: https://lcsc.com/product-detail/Inductors-SMD_TDK-TDK-MLP2012S4R7MT0S1_C87543.html
footprint IND-0805 (0805 (2012M) Inductor)
pins: 1, 2

## MLP2012V1R0MT0S1
designator L?  Inductance: 1uH
Inductor, 1uH, ±20%, 200mΩ, 900mA, SMD 0805; Manufacturer: TDK; Manufacturer Part Number: MLP2012V1R0MT0S1; Package Size: 0805; JLCPCB Basic Part: No; JLCPCB Part Number: C383375; Supplier 1: LCSC; Category: Inductors; Supplier Part Number 1: C383375; Tolerance: ±20%; Rated Current: 900mA; DC Resistance: 200mΩ; RoHS: Yes; ComponentLink1Description: Datasheet; ComponentLink1URL: https://wmsc.lcsc.com/wmsc/upload/file/pdf/v2/lcsc/2304140030_TDK-MLP2012V1R0MT0S1_C383375.pdf; ComponentLink2Description: JLCPCB Part URL; ComponentLink2URL: https://jlcpcb.com/partdetail/C383375; ComponentLink3Description: LCSC Part URL; ComponentLink3URL: https://lcsc.com/product-detail/Inductors-SMD_TDK-TDK-MLP2012V1R0MT0S1_C383375.html
footprint IND-0805 (0805 (2012M) Inductor)
pins: 1, 2

## MLP2012V4R7MT0S1
designator L?  Inductance: 4.7uH
Inductor, 4.7uH, ±20%, 400mΩ, 600mA, SMD 0805; Manufacturer: TDK; Manufacturer Part Number: MLP2012V4R7MT0S1; Package Size: 0805; JLCPCB Basic Part: No; JLCPCB Part Number: C383376; Supplier 1: LCSC; Category: Inductors; Supplier Part Number 1: C383376; Tolerance: ±20%; Rated Current: 600mA; DC Resistance: 400mΩ; RoHS: Yes; ComponentLink1Description: Datasheet; ComponentLink1URL: https://wmsc.lcsc.com/wmsc/upload/file/pdf/v2/lcsc/1912111437_TDK-MLP2012V4R7MT0S1_C383376.pdf; ComponentLink2Description: JLCPCB Part URL; ComponentLink2URL: https://jlcpcb.com/partdetail/C383376; ComponentLink3Description: LCSC Part URL; ComponentLink3URL: https://lcsc.com/product-detail/Inductors-SMD_TDK-TDK-MLP2012V4R7MT0S1_C383376.html
footprint IND-0805 (0805 (2012M) Inductor)
pins: 1, 2

## MLW2012-68N_F_
designator L?  Inductance: 68nH
Inductor, 68nH, ±5%, 380mΩ, 500mA, SMD 0805; Manufacturer: Meled; Manufacturer Part Number: MLW2012-68N(F); Package Size: 0805; JLCPCB Basic Part: No; JLCPCB Part Number: C11775; Supplier 1: LCSC; Category: Inductors; Supplier Part Number 1: C11775; Tolerance: ±5%; Rated Current: 500mA; DC Resistance: 380mΩ; RoHS: Yes; ComponentLink1Description: Datasheet; ComponentLink1URL: https://wmsc.lcsc.com/wmsc/upload/file/pdf/v2/lcsc/1810231214_MetalLions-MLW2012-68N-F_C11775.pdf; ComponentLink2Description: JLCPCB Part URL; ComponentLink2URL: https://jlcpcb.com/partdetail/C11775; ComponentLink3Description: LCSC Part URL; ComponentLink3URL: https://lcsc.com/product-detail/Inductors-SMD_Meled-Meled-MLW2012-68NF_C11775.html
footprint IND-0805 (0805 (2012M) Inductor)
pins: 1, 2

## MLW2012RF-100MT
designator L?  Inductance: 10uH
Inductor, 10uH, ±20%, 850mΩ, 560mA, SMD 0805; Manufacturer: Meled; Manufacturer Part Number: MLW2012RF-100MT; Self-Resonant Frequency: 31MHz; Package Size: 0805; JLCPCB Basic Part: No; JLCPCB Part Number: C2844634; Supplier 1: LCSC; Category: Inductors; Supplier Part Number 1: C2844634; Tolerance: ±20%; Rated Current: 560mA; DC Resistance: 850mΩ; RoHS: Yes; ComponentLink1Description: Datasheet; ComponentLink1URL: https://wmsc.lcsc.com/wmsc/upload/file/pdf/v2/lcsc/2306021146_MetalLions-MLW2012RF-100MT_C2844634.pdf; ComponentLink2Description: JLCPCB Part URL; ComponentLink2URL: https://jlcpcb.com/partdetail/C2844634; ComponentLink3Description: LCSC Part URL; ComponentLink3URL: https://lcsc.com/product-detail/Inductors-SMD_MetalLions-MetalLions-MLW2012RF-100MT_C2844634.html
footprint IND-0805 (0805 (2012M) Inductor)
pins: 1, 2

## MLW2012RF-150MT
designator L?  Inductance: 15uH
Inductor, 15uH, ±20%, 1.4Ω, 380mA, SMD 0805; Manufacturer: Meled; Manufacturer Part Number: MLW2012RF-150MT; Self-Resonant Frequency: 28MHz; Package Size: 0805; JLCPCB Basic Part: No; JLCPCB Part Number: C2844635; Supplier 1: LCSC; Category: Inductors; Supplier Part Number 1: C2844635; Tolerance: ±20%; Rated Current: 380mA; DC Resistance: 1.4Ω; RoHS: Yes; ComponentLink1Description: Datasheet; ComponentLink1URL: https://wmsc.lcsc.com/wmsc/upload/file/pdf/v2/lcsc/2306021146_MetalLions-MLW2012RF-150MT_C2844635.pdf; ComponentLink2Description: JLCPCB Part URL; ComponentLink2URL: https://jlcpcb.com/partdetail/C2844635; ComponentLink3Description: LCSC Part URL; ComponentLink3URL: https://lcsc.com/product-detail/Inductors-SMD_MetalLions-MetalLions-MLW2012RF-150MT_C2844635.html
footprint IND-0805 (0805 (2012M) Inductor)
pins: 1, 2

## MLW2012RF-220MT
designator L?  Inductance: 22uH
Inductor, 22uH, ±20%, 1.76Ω, 340mA, SMD 0805; Manufacturer: Meled; Manufacturer Part Number: MLW2012RF-220MT; Self-Resonant Frequency: 20MHz; Package Size: 0805; JLCPCB Basic Part: No; JLCPCB Part Number: C2844636; Supplier 1: LCSC; Category: Inductors; Supplier Part Number 1: C2844636; Tolerance: ±20%; Rated Current: 340mA; DC Resistance: 1.76Ω; RoHS: Yes; ComponentLink1Description: Datasheet; ComponentLink1URL: https://wmsc.lcsc.com/wmsc/upload/file/pdf/v2/lcsc/2306021146_MetalLions-MLW2012RF-220MT_C2844636.pdf; ComponentLink2Description: JLCPCB Part URL; ComponentLink2URL: https://jlcpcb.com/partdetail/C2844636; ComponentLink3Description: LCSC Part URL; ComponentLink3URL: https://lcsc.com/product-detail/Inductors-SMD_MetalLions-MetalLions-MLW2012RF-220MT_C2844636.html
footprint IND-0805 (0805 (2012M) Inductor)
pins: 1, 2

## MLZ2012A1R0MT000
designator L?  Inductance: 1uH
Inductor, 1uH, ±20%, 100mΩ, SMD 0805; Manufacturer: TDK; Manufacturer Part Number: MLZ2012A1R0MT000; Saturation Current: 280mA; Self-Resonant Frequency: 160MHz; Package Size: 0805; JLCPCB Basic Part: No; JLCPCB Part Number: C383397; Supplier 1: LCSC; Category: Inductors; Supplier Part Number 1: C383397; Tolerance: ±20%; DC Resistance: 100mΩ; RoHS: Yes; ComponentLink1Description: Datasheet; ComponentLink1URL: https://wmsc.lcsc.com/wmsc/upload/file/pdf/v2/lcsc/2401221244_TDK-MLZ2012A1R0MT000_C383397.pdf; ComponentLink2Description: JLCPCB Part URL; ComponentLink2URL: https://jlcpcb.com/partdetail/C383397; ComponentLink3Description: LCSC Part URL; ComponentLink3URL: https://lcsc.com/product-detail/Inductors-SMD_TDK-TDK-MLZ2012A1R0MT000_C383397.html
footprint IND-0805 (0805 (2012M) Inductor)
pins: 1, 2

## MLZ2012A1R0WT000
designator L?  Inductance: 1uH
Inductor, 1uH, ±20%, 100mΩ, 900mA, SMD 0805; Manufacturer: TDK; Manufacturer Part Number: MLZ2012A1R0WT000; Saturation Current: 280mA; Self-Resonant Frequency: 10MHz; Package Size: 0805; JLCPCB Basic Part: No; JLCPCB Part Number: C88171; Supplier 1: LCSC; Category: Inductors; Supplier Part Number 1: C88171; Tolerance: ±20%; Rated Current: 900mA; DC Resistance: 100mΩ; RoHS: Yes; ComponentLink1Description: Datasheet; ComponentLink1URL: https://wmsc.lcsc.com/wmsc/upload/file/pdf/v2/lcsc/1810132030_TDK-MLZ2012A1R0WT000_C88171.pdf; ComponentLink2Description: JLCPCB Part URL; ComponentLink2URL: https://jlcpcb.com/partdetail/C88171; ComponentLink3Description: LCSC Part URL; ComponentLink3URL: https://lcsc.com/product-detail/Inductors-SMD_TDK-TDK-MLZ2012A1R0WT000_C88171.html
footprint IND-0805 (0805 (2012M) Inductor)
pins: 1, 2

## MLZ2012A2R2WT000
designator L?  Inductance: 2.2uH
Inductor, 2.2uH, ±20%, 150mΩ, 650mA, SMD 0805; Manufacturer: TDK; Manufacturer Part Number: MLZ2012A2R2WT000; Saturation Current: 210mA; Self-Resonant Frequency: 10MHz; Package Size: 0805; JLCPCB Basic Part: No; JLCPCB Part Number: C383398; Supplier 1: LCSC; Category: Inductors; Supplier Part Number 1: C383398; Tolerance: ±20%; Rated Current: 650mA; DC Resistance: 150mΩ; RoHS: Yes; ComponentLink1Description: Datasheet; ComponentLink1URL: https://wmsc.lcsc.com/wmsc/upload/file/pdf/v2/lcsc/2304140030_TDK-MLZ2012A2R2WT000_C383398.pdf; ComponentLink2Description: JLCPCB Part URL; ComponentLink2URL: https://jlcpcb.com/partdetail/C383398; ComponentLink3Description: LCSC Part URL; ComponentLink3URL: https://lcsc.com/product-detail/Inductors-SMD_TDK-TDK-MLZ2012A2R2WT000_C383398.html
footprint IND-0805 (0805 (2012M) Inductor)
pins: 1, 2

## MLZ2012A3R3WT000
designator L?  Inductance: 3.3uH
Inductor, 3.3uH, ±20%, 340mΩ, 450mA, SMD 0805; Manufacturer: TDK; Manufacturer Part Number: MLZ2012A3R3WT000; Saturation Current: 200mA; Package Size: 0805; JLCPCB Basic Part: No; JLCPCB Part Number: C383399; Supplier 1: LCSC; Category: Inductors; Supplier Part Number 1: C383399; Tolerance: ±20%; Rated Current: 450mA; DC Resistance: 340mΩ; RoHS: Yes; ComponentLink1Description: Datasheet; ComponentLink1URL: https://wmsc.lcsc.com/wmsc/upload/file/pdf/v2/lcsc/2304140030_TDK-MLZ2012A3R3WT000_C383399.pdf; ComponentLink2Description: JLCPCB Part URL; ComponentLink2URL: https://jlcpcb.com/partdetail/C383399; ComponentLink3Description: LCSC Part URL; ComponentLink3URL: https://lcsc.com/product-detail/Inductors-SMD_TDK-TDK-MLZ2012A3R3WT000_C383399.html
footprint IND-0805 (0805 (2012M) Inductor)
pins: 1, 2

## MLZ2012DR47DT000
designator L?  Inductance: 470nH
Inductor, 470nH, ±20%, 180mΩ, SMD 0805; Manufacturer: TDK; Manufacturer Part Number: MLZ2012DR47DT000; Saturation Current: 550mA; Package Size: 0805; JLCPCB Basic Part: No; JLCPCB Part Number: C383400; Supplier 1: LCSC; Category: Inductors; Supplier Part Number 1: C383400; Tolerance: ±20%; DC Resistance: 180mΩ; RoHS: Yes; ComponentLink1Description: Datasheet; ComponentLink1URL: https://wmsc.lcsc.com/wmsc/upload/file/pdf/v2/lcsc/2401221244_TDK-MLZ2012DR47DT000_C383400.pdf; ComponentLink2Description: JLCPCB Part URL; ComponentLink2URL: https://jlcpcb.com/partdetail/C383400; ComponentLink3Description: LCSC Part URL; ComponentLink3URL: https://lcsc.com/product-detail/Inductors-SMD_TDK-TDK-MLZ2012DR47DT000_C383400.html
footprint IND-0805 (0805 (2012M) Inductor)
pins: 1, 2

## MLZ2012DR47DTD25
designator L?  Inductance: 470nH
Inductor, 470nH, ±20%, 180mΩ, 700mA, SMD 0805; Manufacturer: TDK; Manufacturer Part Number: MLZ2012DR47DTD25; Saturation Current: 550mA; Package Size: 0805; JLCPCB Basic Part: No; JLCPCB Part Number: C404752; Supplier 1: LCSC; Category: Inductors; Supplier Part Number 1: C404752; Tolerance: ±20%; Rated Current: 700mA; DC Resistance: 180mΩ; RoHS: Yes; ComponentLink1Description: Datasheet; ComponentLink1URL: https://wmsc.lcsc.com/wmsc/upload/file/pdf/v2/lcsc/2304140030_TDK-MLZ2012DR47DTD25_C404752.pdf; ComponentLink2Description: JLCPCB Part URL; ComponentLink2URL: https://jlcpcb.com/partdetail/C404752; ComponentLink3Description: LCSC Part URL; ComponentLink3URL: https://lcsc.com/product-detail/Inductors-SMD_TDK-TDK-MLZ2012DR47DTD25_C404752.html
footprint IND-0805 (0805 (2012M) Inductor)
pins: 1, 2

## MLZ2012E100MT000
designator L?  Inductance: 10uH
Inductor, 10uH, ±20%, 400mΩ, 60mA, SMD 0805; Manufacturer: TDK; Manufacturer Part Number: MLZ2012E100MT000; Package Size: 0805; JLCPCB Basic Part: No; JLCPCB Part Number: C531289; Supplier 1: LCSC; Category: Inductors; Supplier Part Number 1: C531289; Tolerance: ±20%; Rated Current: 60mA; DC Resistance: 400mΩ; RoHS: Yes; ComponentLink1Description: Datasheet; ComponentLink1URL: https://wmsc.lcsc.com/wmsc/upload/file/pdf/v2/lcsc/2304140030_TDK-MLZ2012E100MT000_C531289.pdf; ComponentLink2Description: JLCPCB Part URL; ComponentLink2URL: https://jlcpcb.com/partdetail/C531289; ComponentLink3Description: LCSC Part URL; ComponentLink3URL: https://lcsc.com/product-detail/Inductors-SMD_TDK-TDK-MLZ2012E100MT000_C531289.html
footprint IND-0805 (0805 (2012M) Inductor)
pins: 1, 2
